# Altium footprint library Connectors.PcbLib: 74 footprints (part 3 of 5)
Each footprint in its own frame and in the unit in brackets; x right, y up, seen from the top. Pads: shape width x height; smd on the part's side, far side on the other; paste and mask are expansions set on the pad; w line width, h text height; cw(c..) or ccw(c..) is an arc to the next point about the centre after c.
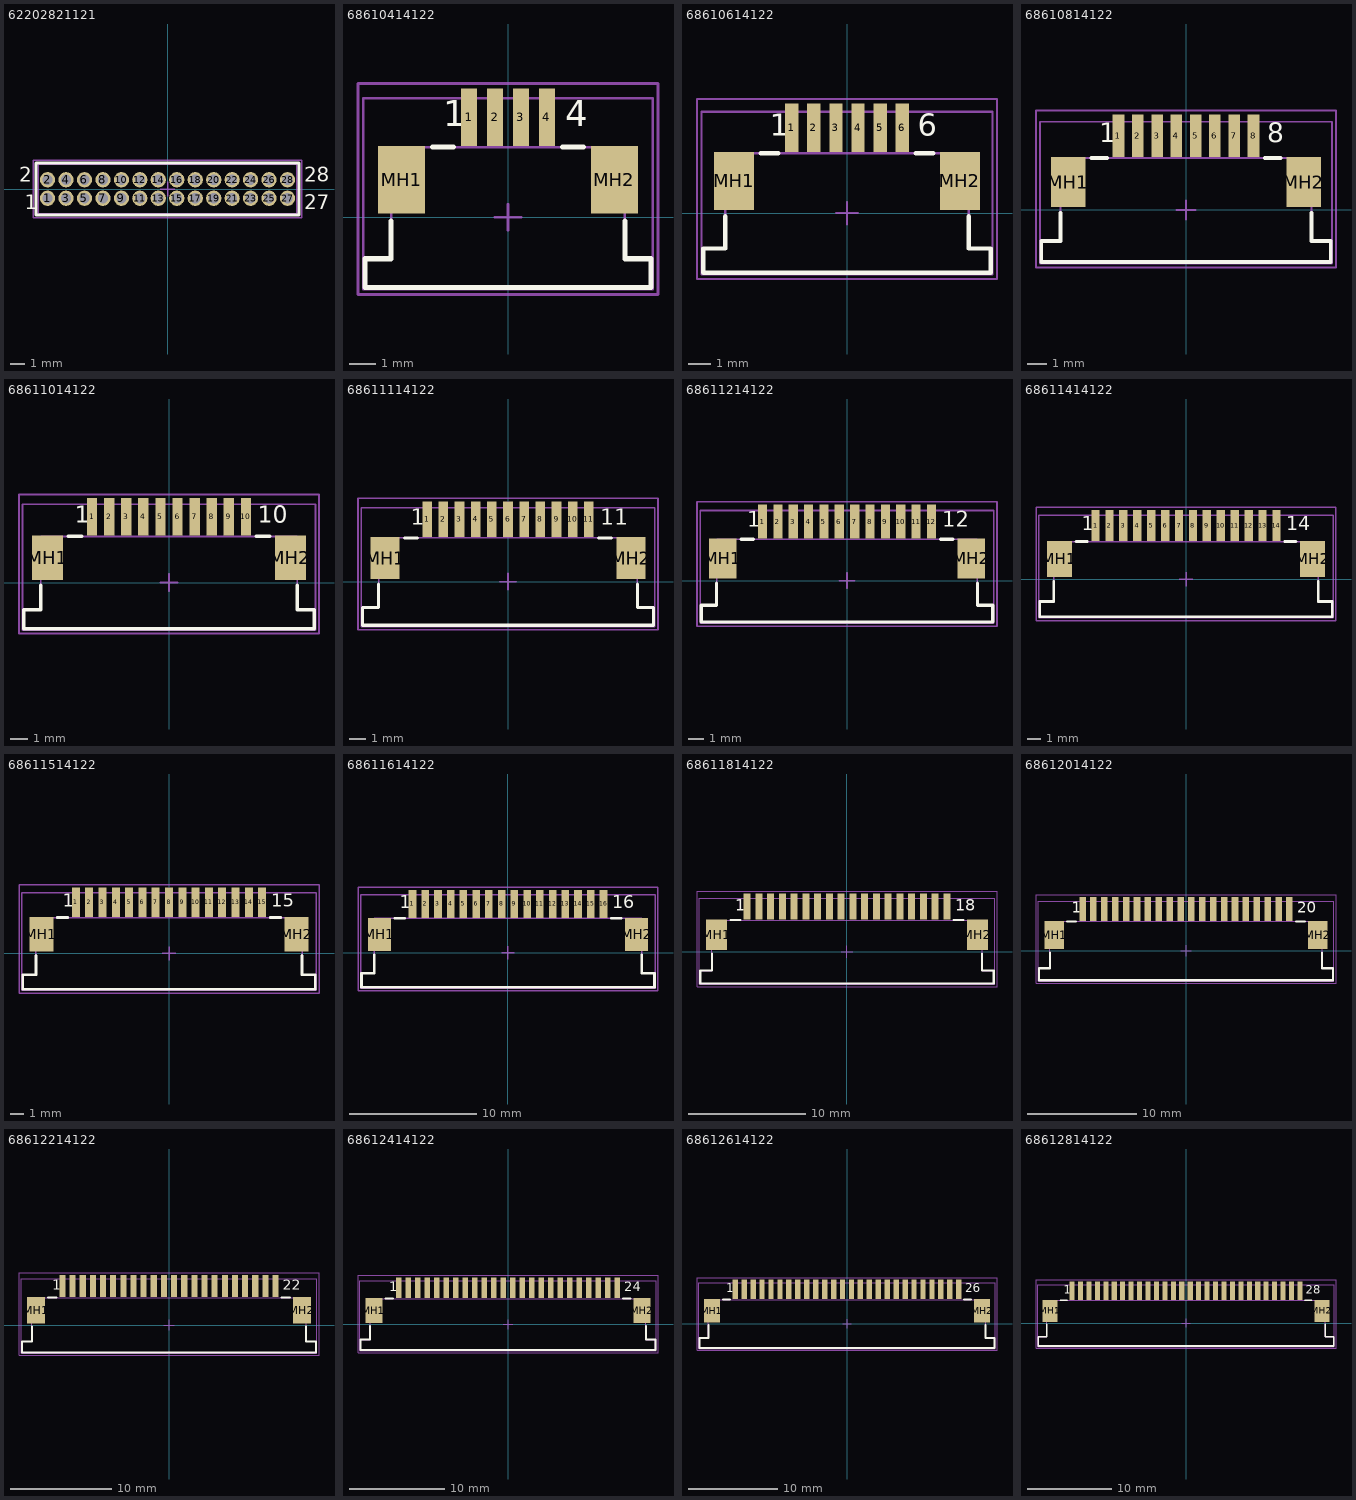
[diagram p2: the footprints below, top view; thin cyan lines are the x and y axes]

## 62202821121 [mm] "Pin Header, pitch 1.27 mm, THT, Vertical, dual row, 28p"
height 5.65
pads (28):
  round 1.05 hole 0.7: 1(-8.255,-0.635) 2(-8.255,0.635) 3(-6.985,-0.635) 4(-6.985,0.635) 5(-5.715,-0.635) 6(-5.715,0.635) 7(-4.445,-0.635) 8(-4.445,0.635) 9(-3.175,-0.635) 10(-3.175,0.635) 11(-1.905,-0.635) 12(-1.905,0.635) 13(-0.635,-0.635) 14(-0.635,0.635) 15(0.635,-0.635) 16(0.635,0.635) 17(1.905,-0.635) 18(1.905,0.635) 19(3.175,-0.635) 20(3.175,0.635) 21(4.445,-0.635) 22(4.445,0.635) 23(5.715,-0.635) 24(5.715,0.635) 25(6.985,-0.635) 26(6.985,0.635) 27(8.255,-0.635) 28(8.255,0.635)
Top Overlay:
  lines w0.2: -9.04,-1.775 -9.04,1.775 9.04,1.775 9.04,-1.775 -9.04,-1.775
  text "28" at 9.42,0.5 h1
  text "27" at 9.42,-1.4 h1
  text "1" at -9.82,-1.4 h1
  text "2" at -10.22,0.5 h1
Mechanical 11:
  lines w0.1: -8.89,-1.7 -8.89,1.7 8.89,1.7 8.89,-1.7 -8.89,-1.7
Mechanical 13:
  lines w0.1: -9.04,-1.775 -9.04,1.775 9.04,1.775 9.04,-1.775 -9.04,-1.775
Mechanical 15:
  lines w0.1: -0.5,0 0.5,0 ; 0,-0.5 0,0.5 ; -9.24,-1.975 9.24,-1.975 9.24,1.975 -9.24,1.975 -9.24,-1.975
3D body "62202821121.stp": height 5.33, standoff -2.27, extent -8.89,-1.7 8.89,1.7

## 68610414122 [mm] "ZIF Connectors, Horizontal, Top Contact, pitch 1mm, 4p"
height 3.15
pads (6):
  rect 0.6x2.2 smd: 1(-1.5,3.85) 2(-0.5,3.85) 3(0.5,3.85) 4(1.5,3.85)
  rect 1.8x2.6 smd: MH1(-4.1,1.45) MH2(4.1,1.45)
Top Overlay:
  lines w0.2: -4.5,-0.15 -4.5,-1.6 -5.5,-1.6 -5.5,-2.7 5.5,-2.7 5.5,-1.6 4.5,-1.6 4.5,-0.15 ; -2.9,2.7 -2.1,2.7 ; 2.1,2.7 2.9,2.7
  text "4" at 2.2,3.5 h1
  text "1" at -2.5,3.5 h1
Mechanical 11:
  lines w0.1: -5.5,-2.7 -5.5,-1.6 -4.5,-1.6 -4.5,2.7 4.5,2.7 4.5,-1.6 5.5,-1.6 5.5,-2.7 -5.5,-2.7
Mechanical 13:
  lines w0.1: -5.575,-2.775 5.575,-2.775 5.575,4.575 -5.575,4.575 -5.575,-2.775
Mechanical 15:
  lines w0.1: -0.5,0 0.5,0 ; 0,-0.5 0,0.5 ; -5.775,-2.975 -5.775,5.15 5.775,5.15 5.775,-2.975 -5.775,-2.975
3D body "68610414122.stp": height 3.02, standoff 0.02, extent -5.5,-2.7 5.5,4.4

## 68610614122 [mm] "ZIF Connectors, Horizontal, Top Contact, pitch 1mm, 6p"
height 3.15
pads (8):
  rect 0.6x2.2 smd: 1(-2.5,3.85) 2(-1.5,3.85) 3(-0.5,3.85) 4(0.5,3.85) 5(1.5,3.85) 6(2.5,3.85)
  rect 1.8x2.6 smd: MH1(-5.1,1.45) MH2(5.1,1.45)
Top Overlay:
  lines w0.2: -5.5,-0.15 -5.5,-1.6 -6.5,-1.6 -6.5,-2.7 6.5,-2.7 6.5,-1.6 5.5,-1.6 5.5,-0.15 ; -3.9,2.7 -3.1,2.7 ; 3.1,2.7 3.9,2.7
  text "6" at 3.2,3.5 h1
  text "1" at -3.5,3.5 h1
Mechanical 11:
  lines w0.1: -6.5,-2.7 6.5,-2.7 6.5,-1.6 5.5,-1.6 5.5,2.7 -5.5,2.7 -5.5,-1.6 -6.5,-1.6 -6.5,-2.7
Mechanical 13:
  lines w0.1: -6.575,-2.775 -6.575,4.575 6.575,4.575 6.575,-2.775 -6.575,-2.775
Mechanical 15:
  lines w0.1: -0.5,0 0.5,0 ; 0,-0.5 0,0.5 ; -6.775,-2.975 6.775,-2.975 6.775,5.15 -6.775,5.15 -6.775,-2.975
3D body "68610614122.stp": height 3.02, standoff 0.02, extent -6.5,-2.7 6.5,4.4

## 68610814122 [mm] "ZIF Connectors, Horizontal, Top Contact, pitch 1mm, 8p"
height 3.15
pads (10):
  rect 0.6x2.2 smd: 1(-3.5,3.85) 2(-2.5,3.85) 3(-1.5,3.85) 4(-0.5,3.85) 5(0.5,3.85) 6(1.5,3.85) 7(2.5,3.85) 8(3.5,3.85)
  rect 1.8x2.6 smd: MH1(-6.1,1.45) MH2(6.1,1.45)
Top Overlay:
  lines w0.2: -6.5,-0.15 -6.5,-1.6 -7.5,-1.6 -7.5,-2.7 7.5,-2.7 7.5,-1.6 6.5,-1.6 6.5,-0.15 ; -4.9,2.7 -4.1,2.7 ; 4.1,2.7 4.9,2.7
  text "1" at -4.5,3.5 h1
  text "8" at 4.2,3.5 h1
Mechanical 11:
  lines w0.1: -7.5,-2.7 7.5,-2.7 7.5,-1.6 6.5,-1.6 6.5,2.7 -6.5,2.7 -6.5,-1.6 -7.5,-1.6 -7.5,-2.7
Mechanical 13:
  lines w0.1: -7.575,-2.775 -7.575,4.575 7.575,4.575 7.575,-2.775 -7.575,-2.775
Mechanical 15:
  lines w0.1: -0.5,0 0.5,0 ; 0,-0.5 0,0.5 ; -7.775,-2.975 7.775,-2.975 7.775,5.15 -7.775,5.15 -7.775,-2.975
3D body "68610814122.stp": height 3.02, standoff 0.02, extent -7.5,-2.7 7.5,4.4

## 68611014122 [mm] "ZIF Connectors, Horizontal, Top Contact, pitch 1mm, 10p"
height 3.15
pads (12):
  rect 0.6x2.2 smd: 1(-4.5,3.85) 2(-3.5,3.85) 3(-2.5,3.85) 4(-1.5,3.85) 5(-0.5,3.85) 6(0.5,3.85) 7(1.5,3.85) 8(2.5,3.85) 9(3.5,3.85) 10(4.5,3.85)
  rect 1.8x2.6 smd: MH1(-7.1,1.45) MH2(7.1,1.45)
Top Overlay:
  lines w0.2: -7.5,-0.15 -7.5,-1.6 -8.5,-1.6 -8.5,-2.7 8.5,-2.7 8.5,-1.6 7.5,-1.6 7.5,-0.15 ; -5.9,2.7 -5.1,2.7 ; 5.1,2.7 5.9,2.7
  text "10" at 5.2,3.5 h1
  text "1" at -5.5,3.5 h1
Mechanical 11:
  lines w0.1: -8.5,-2.7 8.5,-2.7 8.5,-1.6 7.5,-1.6 7.5,2.7 -7.5,2.7 -7.5,-1.6 -8.5,-1.6 -8.5,-2.7
Mechanical 13:
  lines w0.1: -8.575,-2.775 -8.575,4.575 8.575,4.575 8.575,-2.775 -8.575,-2.775
Mechanical 15:
  lines w0.1: -0.5,0 0.5,0 ; 0,-0.5 0,0.5 ; -8.775,-2.975 8.775,-2.975 8.775,5.15 -8.775,5.15 -8.775,-2.975
3D body "68611014122.stp": height 3.02, standoff 0.02, extent -8.5,-2.7 8.5,4.4

## 68611114122 [mm] "ZIF Connectors, Horizontal, Top Contact, pitch 1mm, 11p"
height 3.15
pads (13):
  rect 0.6x2.2 smd: 1(-5,3.85) 2(-4,3.85) 3(-3,3.85) 4(-2,3.85) 5(-1,3.85) 6(0,3.85) 7(1,3.85) 8(2,3.85) 9(3,3.85) 10(4,3.85) 11(5,3.85)
  rect 1.8x2.6 smd: MH1(-7.6,1.45) MH2(7.6,1.45)
Top Overlay:
  lines w0.2: -8,-0.15 -8,-1.6 -9,-1.6 -9,-2.7 9,-2.7 9,-1.6 8,-1.6 8,-0.15 ; -6.4,2.7 -5.6,2.7 ; 5.6,2.7 6.4,2.7
  text "1" at -6,3.5 h1
  text "11" at 5.7,3.5 h1
Mechanical 11:
  lines w0.1: -9,-2.7 -9,-1.6 -8,-1.6 -8,2.7 8,2.7 8,-1.6 9,-1.6 9,-2.7 -9,-2.7
Mechanical 13:
  lines w0.1: -9.075,-2.775 9.075,-2.775 9.075,4.575 -9.075,4.575 -9.075,-2.775
Mechanical 15:
  lines w0.1: -0.5,0 0.5,0 ; 0,-0.5 0,0.5 ; -9.275,-2.975 -9.275,5.15 9.275,5.15 9.275,-2.975 -9.275,-2.975
3D body "68611114122.stp": height 3.02, standoff 0.02, extent -9,-2.7 9,4.4

## 68611214122 [mm] "ZIF Connectors, Horizontal, Top Contact, pitch 1mm, 12p"
height 3.15
pads (14):
  rect 0.6x2.2 smd: 1(-5.5,3.85) 2(-4.5,3.85) 3(-3.5,3.85) 4(-2.5,3.85) 5(-1.5,3.85) 6(-0.5,3.85) 7(0.5,3.85) 8(1.5,3.85) 9(2.5,3.85) 10(3.5,3.85) 11(4.5,3.85) 12(5.5,3.85)
  rect 1.8x2.6 smd: MH1(-8.1,1.45) MH2(8.1,1.45)
Top Overlay:
  lines w0.2: -8.5,-0.15 -8.5,-1.6 -9.5,-1.6 -9.5,-2.7 9.5,-2.7 9.5,-1.6 8.5,-1.6 8.5,-0.15 ; -6.9,2.7 -6.1,2.7 ; 6.1,2.7 6.9,2.7
  text "1" at -6.5,3.5 h1
  text "12" at 6.2,3.5 h1
Mechanical 11:
  lines w0.1: -9.5,-2.7 -9.5,-1.6 -8.5,-1.6 -8.5,2.7 8.5,2.7 8.5,-1.6 9.5,-1.6 9.5,-2.7 -9.5,-2.7
Mechanical 13:
  lines w0.1: -9.575,-2.775 9.575,-2.775 9.575,4.575 -9.575,4.575 -9.575,-2.775
Mechanical 15:
  lines w0.1: -0.5,0 0.5,0 ; 0,-0.5 0,0.5 ; -9.775,-2.975 -9.775,5.15 9.775,5.15 9.775,-2.975 -9.775,-2.975
3D body "68611214122.stp": height 3.02, standoff 0.02, extent -9.5,-2.7 9.5,4.4

## 68611414122 [mm] "ZIF Connectors, Horizontal, Top Contact, pitch 1mm, 14p"
height 3.15
pads (16):
  rect 0.6x2.2 smd: 1(-6.5,3.85) 2(-5.5,3.85) 3(-4.5,3.85) 4(-3.5,3.85) 5(-2.5,3.85) 6(-1.5,3.85) 7(-0.5,3.85) 8(0.5,3.85) 9(1.5,3.85) 10(2.5,3.85) 11(3.5,3.85) 12(4.5,3.85) 13(5.5,3.85) 14(6.5,3.85)
  rect 1.8x2.6 smd: MH1(-9.1,1.45) MH2(9.1,1.45)
Top Overlay:
  lines w0.2: -9.5,-0.15 -9.5,-1.6 -10.5,-1.6 -10.5,-2.7 10.5,-2.7 10.5,-1.6 9.5,-1.6 9.5,-0.15 ; -7.9,2.7 -7.1,2.7 ; 7.1,2.7 7.9,2.7
  text "1" at -7.5,3.5 h1
  text "14" at 7.2,3.5 h1
Mechanical 11:
  lines w0.1: -10.5,-2.7 -10.5,-1.6 -9.5,-1.6 -9.5,2.7 9.5,2.7 9.5,-1.6 10.5,-1.6 10.5,-2.7 -10.5,-2.7
Mechanical 13:
  lines w0.1: -10.575,-2.775 10.575,-2.775 10.575,4.575 -10.575,4.575 -10.575,-2.775
Mechanical 15:
  lines w0.1: -0.5,0 0.5,0 ; 0,-0.5 0,0.5 ; -10.775,-2.975 -10.775,5.15 10.775,5.15 10.775,-2.975 -10.775,-2.975
3D body "68611414122.stp": height 3.02, standoff 0.02, extent -10.5,-2.7 10.5,4.4

## 68611514122 [mm] "ZIF Connectors, Horizontal, Top Contact, pitch 1mm, 15p"
height 3.15
pads (17):
  rect 0.6x2.2 smd: 1(-7,3.85) 2(-6,3.85) 3(-5,3.85) 4(-4,3.85) 5(-3,3.85) 6(-2,3.85) 7(-1,3.85) 8(0,3.85) 9(1,3.85) 10(2,3.85) 11(3,3.85) 12(4,3.85) 13(5,3.85) 14(6,3.85) 15(7,3.85)
  rect 1.8x2.6 smd: MH1(-9.6,1.45) MH2(9.6,1.45)
Top Overlay:
  lines w0.2: -10,-0.15 -10,-1.6 -11,-1.6 -11,-2.7 11,-2.7 11,-1.6 10,-1.6 10,-0.15 ; -8.4,2.7 -7.6,2.7 ; 7.6,2.7 8.4,2.7
  text "1" at -8,3.5 h1
  text "15" at 7.7,3.5 h1
Mechanical 11:
  lines w0.1: -11,-2.7 11,-2.7 11,-1.6 10,-1.6 10,2.7 -10,2.7 -10,-1.6 -11,-1.6 -11,-2.7
Mechanical 13:
  lines w0.1: -11.075,-2.775 -11.075,4.575 11.075,4.575 11.075,-2.775 -11.075,-2.775
Mechanical 15:
  lines w0.1: -0.5,0 0.5,0 ; 0,-0.5 0,0.5 ; -11.275,-2.975 11.275,-2.975 11.275,5.15 -11.275,5.15 -11.275,-2.975
3D body "68611514122.stp": height 3.02, standoff 0.02, extent -11,-2.7 11,4.4

## 68611614122 [mm] "ZIF Connectors, Horizontal, Top Contact, pitch 1mm, 16p"
height 3.15
pads (18):
  rect 0.6x2.2 smd: 1(-7.5,3.85) 2(-6.5,3.85) 3(-5.5,3.85) 4(-4.5,3.85) 5(-3.5,3.85) 6(-2.5,3.85) 7(-1.5,3.85) 8(-0.5,3.85) 9(0.5,3.85) 10(1.5,3.85) 11(2.5,3.85) 12(3.5,3.85) 13(4.5,3.85) 14(5.5,3.85) 15(6.5,3.85) 16(7.5,3.85)
  rect 1.8x2.6 smd: MH1(-10.1,1.45) MH2(10.1,1.45)
Top Overlay:
  lines w0.2: -10.5,-0.15 -10.5,-1.6 -11.5,-1.6 -11.5,-2.7 11.5,-2.7 11.5,-1.6 10.5,-1.6 10.5,-0.15 ; -8.9,2.7 -8.1,2.7 ; 8.1,2.7 8.9,2.7
  text "16" at 8.2,3.5 h1
  text "1" at -8.5,3.5 h1
Mechanical 11:
  lines w0.1: -11.5,-2.7 11.5,-2.7 11.5,-1.6 10.5,-1.6 10.5,2.7 -10.5,2.7 -10.5,-1.6 -11.5,-1.6 -11.5,-2.7
Mechanical 13:
  lines w0.1: -11.575,-2.775 -11.575,4.575 11.575,4.575 11.575,-2.775 -11.575,-2.775
Mechanical 15:
  lines w0.1: -0.5,0 0.5,0 ; 0,-0.5 0,0.5 ; -11.775,-2.975 11.775,-2.975 11.775,5.15 -11.775,5.15 -11.775,-2.975
3D body "68611614122.stp": height 3.02, standoff 0.02, extent -11.5,-2.7 11.5,4.4

## 68611814122 [mm] "ZIF Connectors, Horizontal, Top Contact, pitch 1mm, 18p"
height 3.15
pads (20):
  rect 0.6x2.2 smd: 1(-8.5,3.85) 2(-7.5,3.85) 3(-6.5,3.85) 4(-5.5,3.85) 5(-4.5,3.85) 6(-3.5,3.85) 7(-2.5,3.85) 8(-1.5,3.85) 9(-0.5,3.85) 10(0.5,3.85) 11(1.5,3.85) 12(2.5,3.85) 13(3.5,3.85) 14(4.5,3.85) 15(5.5,3.85) 16(6.5,3.85) 17(7.5,3.85) 18(8.5,3.85)
  rect 1.8x2.6 smd: MH1(-11.1,1.45) MH2(11.1,1.45)
Top Overlay:
  lines w0.2: -11.5,-0.15 -11.5,-1.6 -12.5,-1.6 -12.5,-2.7 12.5,-2.7 12.5,-1.6 11.5,-1.6 11.5,-0.15 ; -9.9,2.7 -9.1,2.7 ; 9.1,2.7 9.9,2.7
  text "1" at -9.5,3.5 h1
  text "18" at 9.2,3.5 h1
Mechanical 11:
  lines w0.1: -12.5,-2.7 -12.5,-1.6 -11.5,-1.6 -11.5,2.7 11.5,2.7 11.5,-1.6 12.5,-1.6 12.5,-2.7 -12.5,-2.7
Mechanical 13:
  lines w0.1: -12.575,-2.775 12.575,-2.775 12.575,4.575 -12.575,4.575 -12.575,-2.775
Mechanical 15:
  lines w0.1: -0.5,0 0.5,0 ; 0,-0.5 0,0.5 ; -12.775,-2.975 -12.775,5.15 12.775,5.15 12.775,-2.975 -12.775,-2.975
3D body "68611814122.stp": height 3.02, standoff 0.02, extent -12.5,-2.7 12.5,4.4

## 68612014122 [mm] "ZIF Connectors, Horizontal, Top Contact, pitch 1mm, 20p"
height 3.15
pads (22):
  rect 0.6x2.2 smd: 1(-9.5,3.85) 2(-8.5,3.85) 3(-7.5,3.85) 4(-6.5,3.85) 5(-5.5,3.85) 6(-4.5,3.85) 7(-3.5,3.85) 8(-2.5,3.85) 9(-1.5,3.85) 10(-0.5,3.85) 11(0.5,3.85) 12(1.5,3.85) 13(2.5,3.85) 14(3.5,3.85) 15(4.5,3.85) 16(5.5,3.85) 17(6.5,3.85) 18(7.5,3.85) 19(8.5,3.85) 20(9.5,3.85)
  rect 1.8x2.6 smd: MH1(-12.1,1.45) MH2(12.1,1.45)
Top Overlay:
  lines w0.2: -12.5,-0.15 -12.5,-1.6 -13.5,-1.6 -13.5,-2.7 13.5,-2.7 13.5,-1.6 12.5,-1.6 12.5,-0.15 ; -10.9,2.7 -10.1,2.7 ; 10.1,2.7 10.9,2.7
  text "20" at 10.2,3.5 h1
  text "1" at -10.5,3.5 h1
Mechanical 11:
  lines w0.1: -13.5,-2.7 13.5,-2.7 13.5,-1.6 12.5,-1.6 12.5,2.7 -12.5,2.7 -12.5,-1.6 -13.5,-1.6 -13.5,-2.7
Mechanical 13:
  lines w0.1: -13.575,-2.775 -13.575,4.575 13.575,4.575 13.575,-2.775 -13.575,-2.775
Mechanical 15:
  lines w0.1: -0.5,0 0.5,0 ; 0,-0.5 0,0.5 ; -13.775,-2.975 13.775,-2.975 13.775,5.15 -13.775,5.15 -13.775,-2.975
3D body "68612014122.stp": height 3.02, standoff 0.02, extent -13.5,-2.7 13.5,4.4

## 68612214122 [mm] "ZIF Connectors, Horizontal, Top Contact, pitch 1mm, 22p"
height 3.15
pads (24):
  rect 0.6x2.2 smd: 1(-10.5,3.85) 2(-9.5,3.85) 3(-8.5,3.85) 4(-7.5,3.85) 5(-6.5,3.85) 6(-5.5,3.85) 7(-4.5,3.85) 8(-3.5,3.85) 9(-2.5,3.85) 10(-1.5,3.85) 11(-0.5,3.85) 12(0.5,3.85) 13(1.5,3.85) 14(2.5,3.85) 15(3.5,3.85) 16(4.5,3.85) 17(5.5,3.85) 18(6.5,3.85) 19(7.5,3.85) 20(8.5,3.85) 21(9.5,3.85) 22(10.5,3.85)
  rect 1.8x2.6 smd: MH1(-13.1,1.45) MH2(13.1,1.45)
Top Overlay:
  lines w0.2: -13.5,-0.15 -13.5,-1.6 -14.5,-1.6 -14.5,-2.7 14.5,-2.7 14.5,-1.6 13.5,-1.6 13.5,-0.15 ; -11.9,2.7 -11.1,2.7 ; 11.1,2.7 11.9,2.7
  text "22" at 11.2,3.5 h1
  text "1" at -11.5,3.5 h1
Mechanical 11:
  lines w0.1: -14.5,-2.7 14.5,-2.7 14.5,-1.6 13.5,-1.6 13.5,2.7 -13.5,2.7 -13.5,-1.6 -14.5,-1.6 -14.5,-2.7
Mechanical 13:
  lines w0.1: -14.575,-2.775 -14.575,4.575 14.575,4.575 14.575,-2.775 -14.575,-2.775
Mechanical 15:
  lines w0.1: -0.5,0 0.5,0 ; 0,-0.5 0,0.5 ; -14.775,-2.975 14.775,-2.975 14.775,5.15 -14.775,5.15 -14.775,-2.975
3D body "68612214122.stp": height 3.02, standoff 0.02, extent -14.5,-2.7 14.5,4.4

## 68612414122 [mm] "ZIF Connectors, Horizontal, Top Contact, pitch 1mm, 24p"
height 3.15
pads (26):
  rect 0.6x2.2 smd: 1(-11.5,3.85) 2(-10.5,3.85) 3(-9.5,3.85) 4(-8.5,3.85) 5(-7.5,3.85) 6(-6.5,3.85) 7(-5.5,3.85) 8(-4.5,3.85) 9(-3.5,3.85) 10(-2.5,3.85) 11(-1.5,3.85) 12(-0.5,3.85) 13(0.5,3.85) 14(1.5,3.85) 15(2.5,3.85) 16(3.5,3.85) 17(4.5,3.85) 18(5.5,3.85) 19(6.5,3.85) 20(7.5,3.85) 21(8.5,3.85) 22(9.5,3.85) 23(10.5,3.85) 24(11.5,3.85)
  rect 1.8x2.6 smd: MH1(-14.1,1.45) MH2(14.1,1.45)
Top Overlay:
  lines w0.2: -14.5,-0.15 -14.5,-1.6 -15.5,-1.6 -15.5,-2.7 15.5,-2.7 15.5,-1.6 14.5,-1.6 14.5,-0.15 ; -12.9,2.7 -12.1,2.7 ; 12.1,2.7 12.9,2.7
  text "24" at 12.2,3.5 h1
  text "1" at -12.5,3.5 h1
Mechanical 11:
  lines w0.1: -15.5,-2.7 15.5,-2.7 15.5,-1.6 14.5,-1.6 14.5,2.7 -14.5,2.7 -14.5,-1.6 -15.5,-1.6 -15.5,-2.7
Mechanical 13:
  lines w0.1: -15.575,-2.775 -15.575,4.575 15.575,4.575 15.575,-2.775 -15.575,-2.775
Mechanical 15:
  lines w0.1: -0.5,0 0.5,0 ; 0,-0.5 0,0.5 ; -15.775,-2.975 15.775,-2.975 15.775,5.15 -15.775,5.15 -15.775,-2.975
3D body "68612414122.stp": height 3.02, standoff 0.02, extent -15.5,-2.7 15.5,4.4

## 68612614122 [mm] "ZIF Connectors, Horizontal, Top Contact, pitch 1mm, 26p"
height 3.15
pads (28):
  rect 0.6x2.2 smd: 1(-12.5,3.85) 2(-11.5,3.85) 3(-10.5,3.85) 4(-9.5,3.85) 5(-8.5,3.85) 6(-7.5,3.85) 7(-6.5,3.85) 8(-5.5,3.85) 9(-4.5,3.85) 10(-3.5,3.85) 11(-2.5,3.85) 12(-1.5,3.85) 13(-0.5,3.85) 14(0.5,3.85) 15(1.5,3.85) 16(2.5,3.85) 17(3.5,3.85) 18(4.5,3.85) 19(5.5,3.85) 20(6.5,3.85) 21(7.5,3.85) 22(8.5,3.85) 23(9.5,3.85) 24(10.5,3.85) 25(11.5,3.85) 26(12.5,3.85)
  rect 1.8x2.6 smd: MH1(-15.1,1.45) MH2(15.1,1.45)
Top Overlay:
  lines w0.2: -15.5,-0.15 -15.5,-1.6 -16.5,-1.6 -16.5,-2.7 16.5,-2.7 16.5,-1.6 15.5,-1.6 15.5,-0.15 ; -13.9,2.7 -13.1,2.7 ; 13.1,2.7 13.9,2.7
  text "26" at 13.2,3.5 h1
  text "1" at -13.5,3.5 h1
Mechanical 11:
  lines w0.1: -16.5,-2.7 -16.5,-1.6 -15.5,-1.6 -15.5,2.7 15.5,2.7 15.5,-1.6 16.5,-1.6 16.5,-2.7 -16.5,-2.7
Mechanical 13:
  lines w0.1: -16.575,-2.775 16.575,-2.775 16.575,4.575 -16.575,4.575 -16.575,-2.775
Mechanical 15:
  lines w0.1: -0.5,0 0.5,0 ; 0,-0.5 0,0.5 ; -16.775,-2.975 -16.775,5.15 16.775,5.15 16.775,-2.975 -16.775,-2.975
3D body "68612614122.stp": height 3.02, standoff 0.02, extent -16.5,-2.7 16.5,4.4

## 68612814122 [mm] "ZIF Connectors, Horizontal, Top Contact, pitch 1mm, 28p"
height 3.15
pads (30):
  rect 0.6x2.2 smd: 1(-13.5,3.85) 2(-12.5,3.85) 3(-11.5,3.85) 4(-10.5,3.85) 5(-9.5,3.85) 6(-8.5,3.85) 7(-7.5,3.85) 8(-6.5,3.85) 9(-5.5,3.85) 10(-4.5,3.85) 11(-3.5,3.85) 12(-2.5,3.85) 13(-1.5,3.85) 14(-0.5,3.85) 15(0.5,3.85) 16(1.5,3.85) 17(2.5,3.85) 18(3.5,3.85) 19(4.5,3.85) 20(5.5,3.85) 21(6.5,3.85) 22(7.5,3.85) 23(8.5,3.85) 24(9.5,3.85) 25(10.5,3.85) 26(11.5,3.85) 27(12.5,3.85) 28(13.5,3.85)
  rect 1.8x2.6 smd: MH1(-16.1,1.45) MH2(16.1,1.45)
Top Overlay:
  lines w0.2: -16.5,-0.15 -16.5,-1.6 -17.5,-1.6 -17.5,-2.7 17.5,-2.7 17.5,-1.6 16.5,-1.6 16.5,-0.15 ; -14.9,2.7 -14.1,2.7 ; 14.1,2.7 14.9,2.7
  text "1" at -14.5,3.5 h1
  text "28" at 14.2,3.5 h1
Mechanical 11:
  lines w0.1: -17.5,-2.7 17.5,-2.7 17.5,-1.6 16.5,-1.6 16.5,2.7 -16.5,2.7 -16.5,-1.6 -17.5,-1.6 -17.5,-2.7
Mechanical 13:
  lines w0.1: -17.575,-2.775 -17.575,4.575 17.575,4.575 17.575,-2.775 -17.575,-2.775
Mechanical 15:
  lines w0.1: -0.5,0 0.5,0 ; 0,-0.5 0,0.5 ; -17.775,-2.975 17.775,-2.975 17.775,5.15 -17.775,5.15 -17.775,-2.975
3D body "68612814122.stp": height 3.02, standoff 0.02, extent -17.5,-2.7 17.5,4.4